# Altium footprint library Power_Lib_Altium.PcbLib: 383 footprints (part 4 of 24)
Each footprint in its own frame and in the unit in brackets; x right, y up, seen from the top. Pads: shape width x height; smd on the part's side, far side on the other; paste and mask are expansions set on the pad; w line width, h text height; cw(c..) or ccw(c..) is an arc to the next point about the centre after c.
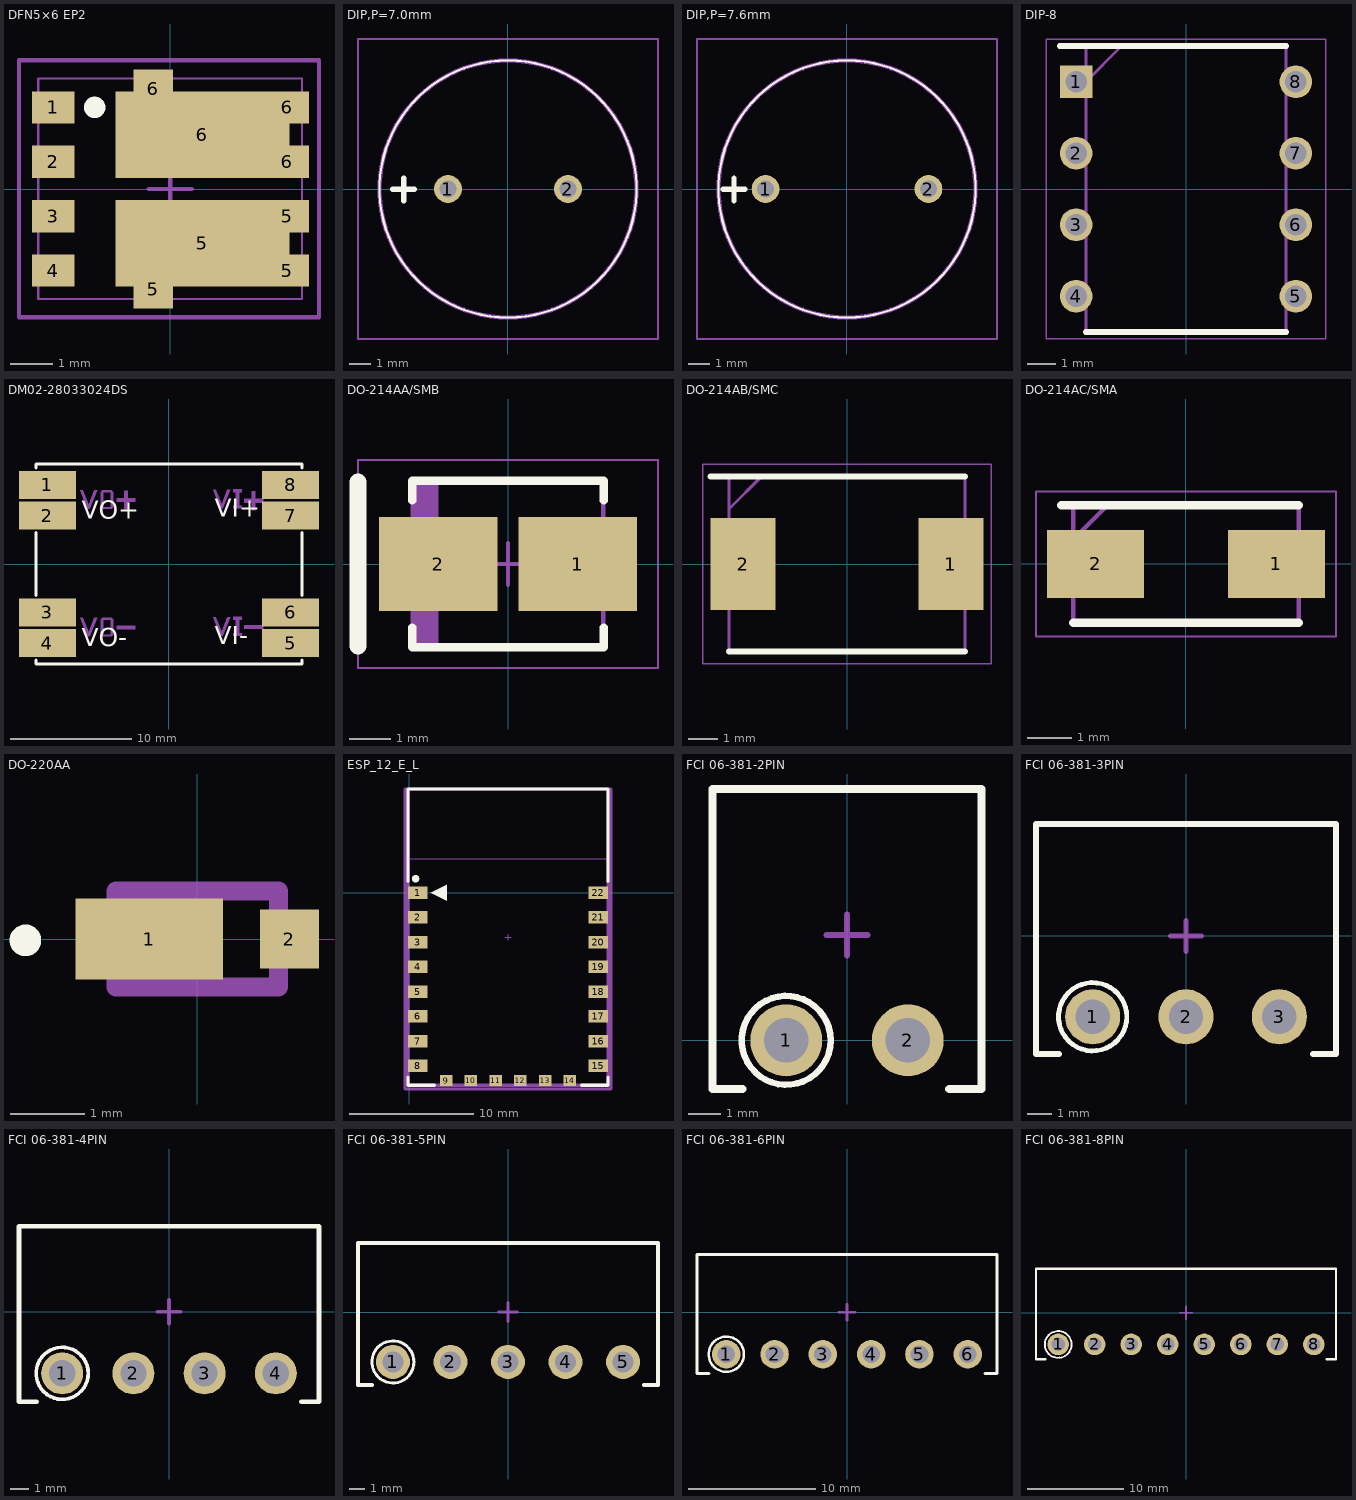
[diagram p3: the footprints below, top view; thin cyan lines are the x and y axes]

## DFN5×6 EP2 [mm]
pads (12):
  rect 1x0.75 smd: 1(-2.73,1.905) 2(-2.73,0.635) 3(-2.73,-0.635) 4(-2.73,-1.905) 5(2.73,-1.905) 5(2.73,-0.635) 6(2.73,0.635) 6(2.73,1.905)
  rect 0.92x0.905 smd: 5(-0.394,-2.337) 6(-0.394,2.337)
  rect 4.055x2.02 smd: 5(0.749,-1.27) 6(0.749,1.27)
Top Overlay:
  circle w0.25: c-1.765,1.905 r0.125
Mechanical 13:
  lines w0.051: -0.254,0 0.254,0 ; 0,-0.254 0,0.254 ; -3.08,-2.57 -3.08,2.58 3.07,2.58 3.07,-2.57 -3.08,-2.57
Mechanical 14:
  lines w0.1: -3.531,-2.995 3.47,-2.995 3.47,3.005 -3.531,3.005 -3.531,-2.995
Mechanical 15:
  lines w0.1: -0.5,0 0.5,0 ; 0,-0.5 0,0.5
3D body "DFN5x6_SO8FL.STEP": height 1.12, standoff -0.01, extent -3.08,-2.57 3.07,2.58

## DIP,P=7.0mm [mm]
pads (2):
  round 1.3 hole 0.8: 1(-2.8,0) 2(2.8,0)
Top Overlay:
  lines w0.1: 0,-6 ccw(c0,0) 0,6 ccw(c0,0) 0,-6
  lines w0.254: -5.382,-0.016 -4.874,-0.016 ; -4.874,0.508 -4.874,-0.54 -4.874,-0.016 ; -4.874,-0.016 -4.366,-0.016 -4.874,-0.016
Mechanical 13:
  lines w0.2: 0,-6 ccw(c0,0) 0,6 ccw(c0,0) 0,-6
Mechanical 15:
  lines w0.1: -7,-7 -7,7 7,7 7,-7 -7,-7
3D body "TMB12A12.stp": height 9.9, standoff -5, extent -6,-6 6,6

## DIP,P=7.6mm [mm]
pads (2):
  round 1.3 hole 0.8: 1(-3.8,0) 2(3.8,0)
Top Overlay:
  lines w0.1: 0,-6 cw(c0,0) 0,6 cw(c0,0) 0,-6
  lines w0.254: -5.782,-0.016 -5.274,-0.016 -4.766,-0.016 ; -5.274,-0.54 -5.274,0.508
Mechanical 13:
  lines w0.2: 0,-6 cw(c0,0) 0,6 cw(c0,0) 0,-6
Mechanical 15:
  lines w0.1: -7,-7 7,-7 7,7 -7,7 -7,-7
3D body "TMB12A12.stp": height 9.9, standoff -5, extent -6,-6 6,6

## DIP-8 [mm]
pads (8):
  rect 1.159x1.159 hole 0.759: 1(-3.905,3.81)
  round 1.159 hole 0.759: 2(-3.905,1.27) 3(-3.905,-1.27) 4(-3.905,-3.81) 5(3.905,-3.81) 6(3.905,-1.27) 7(3.905,1.27) 8(3.905,3.81)
Top Overlay:
  lines w0.2: -4.485,5.08 3.556,5.08 ; -3.556,-5.08 3.556,-5.08
Mechanical 13:
  lines w0.1: -3.556,3.81 -2.286,5.08 ; -3.556,-5.08 3.556,-5.08 3.556,5.08 -3.556,5.08 -3.556,-5.08
Mechanical 15:
  lines w0.05: -4.957,-5.33 4.957,-5.33 4.957,5.33 -4.957,5.33 -4.957,-5.33
3D body "ATTINY85-20PU.stp": height 5.33, standoff -3.5, extent -4.045,-4.75 4.045,4.75

## DM02-28033024DS [mm]
pads (8):
  rect 4.7x2.3 smd: 1(-10.05,6.54) 2(-10.05,4) 3(-10.05,-4) 4(-10.05,-6.54) 5(10.05,-6.54) 6(10.05,-4) 7(10.05,4) 8(10.05,6.54)
Top Overlay:
  lines w0.254: -11,-7.921 -11,-8.25 11,-8.25 11,-7.921 ; -11,-2.619 -11,2.619 ; -11,7.921 -11,8.25 11,8.25 11,7.95 ; 11,-2.619 11,2.619
  text "VI+" at 3.8,3.89 h1.5
  text "VI-" at 3.8,-6.65 h1.5
  text "VO-" at -7.2,-6.79 h1.5
  text "VO+" at -7.2,3.75 h1.5
Mechanical 15:
  circle w0.8: c-11,6.6 r0.4
  region: 6.85,4.45 6.85,5.05 6.85,6 7.15,6 7.15,4.45
  region: 4.801,6.15 4.351,4.95 3.851,6.15 3.651,6.15 4.251,4.6 4.451,4.6 5.051,6.15
  region: 5.3,6.165 6,6.165 6,5.915 5.8,5.915 5.8,4.815 6,4.815 6,4.615 5.3,4.615 5.3,4.815 5.5,4.815 5.5,5.915 5.3,5.915
  region: 6.225,5.375 6.825,5.375 7.775,5.375 7.775,5.075 6.225,5.075
  region: 5.3,-4.375 6,-4.375 6,-4.625 5.8,-4.625 5.8,-5.725 6,-5.725 6,-5.925 5.3,-5.925 5.3,-5.725 5.5,-5.725 5.5,-4.625 5.3,-4.625
  region: 4.8,-4.39 4.35,-5.59 3.85,-4.39 3.65,-4.39 4.25,-5.94 4.45,-5.94 5.05,-4.39
  region: 6.225,-5.05 6.825,-5.05 7.775,-5.05 7.775,-5.35 6.225,-5.35
  region: -6.2,-4.44 -6.65,-5.64 -7.15,-4.44 -7.35,-4.44 -6.75,-5.99 -6.55,-5.99 -5.95,-4.44
  region: -4.6,-5.84 -4.75,-5.99 -5.5,-5.99 -5.65,-5.79 -5.65,-4.59 -5.5,-4.44 -5.45,-4.44 -5.45,-4.59 -5.45,-5.84 -4.8,-5.84 -4.8,-4.59 -5.4,-4.59 -5.4,-4.44 -4.75,-4.44 -4.6,-4.59
  region: -4.325,-5.09 -3.725,-5.09 -2.775,-5.09 -2.775,-5.39 -4.325,-5.39
  region: -3.7,4.525 -3.7,5.125 -3.7,6.075 -3.4,6.075 -3.4,4.525
  region: -4.325,5.45 -3.725,5.45 -2.775,5.45 -2.775,5.15 -4.325,5.15
  region: -4.6,4.7 -4.75,4.55 -5.5,4.55 -5.65,4.75 -5.65,5.95 -5.5,6.1 -5.45,6.1 -5.45,5.95 -5.45,4.7 -4.8,4.7 -4.8,5.95 -5.4,5.95 -5.4,6.1 -4.75,6.1 -4.6,5.95
  region: -6.2,6.1 -6.65,4.9 -7.15,6.1 -7.35,6.1 -6.75,4.55 -6.55,4.55 -5.95,6.1
3D body: height 4.5, standoff 0, extent -10.989,-8.255 10.973,8.248

## DO-214AA/SMB [mm]
pads (2):
  rect 2.85x2.25 smd: 1(1.675,0) 2(-1.675,0)
Top Overlay:
  lines w0.2: -2.3,-1.525 -2.3,-2 2.3,-2 2.3,-1.525 ; -2.3,1.525 -2.3,2 2.3,2 2.3,1.525
  lines w0.4: -3.6,-1.97 -3.6,1.97
Mechanical 13:
  region: -1.67,1.97 -2.285,1.97 -2.285,-1.97 -1.67,-1.97
  lines w0.1: -2.285,-1.97 2.285,-1.97 2.285,1.97 -2.285,1.97 -2.285,-1.97
Mechanical 15:
  lines w0.05: -3.6,-2.5 3.6,-2.5 3.6,2.5 -3.6,2.5 -3.6,-2.5
  lines w0.1: -0.5,0 0.5,0 ; 0,-0.5 0,0.5
3D body "DIOM4336X24M.step": height 2.44, standoff 0, extent -2.505,-1.97 2.505,1.97

## DO-214AB/SMC [mm]
pads (2):
  rect 2.2x3.1 smd: 1(3.5,0) 2(-3.5,0)
Top Overlay:
  lines w0.2: -4.6,2.952 3.97,2.952 ; -3.97,-2.952 3.97,-2.952
Mechanical 13:
  lines w0.1: -3.97,1.852 -2.87,2.952 ; -3.97,-2.952 3.97,-2.952 3.97,2.952 -3.97,2.952 -3.97,-2.952
Mechanical 15:
  lines w0.05: -4.85,-3.36 4.85,-3.36 4.85,3.36 -4.85,3.36 -4.85,-3.36
3D body "B540C-13-F.stp": height 2.5, standoff 0, extent -3.97,-2.953 3.97,2.953

## DO-214AC/SMA [mm]
pads (2):
  rect 2.2x1.55 smd: 1(2.05,0) 2(-2.05,0)
Top Overlay:
  lines w0.2: -2.825,1.332 2.552,1.332 ; -2.552,-1.332 2.552,-1.332
Mechanical 13:
  lines w0.1: -2.552,0.558 -1.778,1.332 ; -2.552,-1.332 2.552,-1.332 2.552,1.332 -2.552,1.332 -2.552,-1.332
Mechanical 15:
  lines w0.05: -3.4,-1.645 3.4,-1.645 3.4,1.645 -3.4,1.645 -3.4,-1.645
3D body "SS14-E3_61T.stp": height 2.29, standoff 0, extent -2.552,-1.332 2.552,1.332

## DO-220AA [mm]
pads (2):
  rect 2x1.1 smd: 1(-0.65,0)
  rect 0.8x0.8 smd: 2(1.25,0)
Top Overlay:
  circle w0.254: c-2.326,-0.019 r0.087
Mechanical 13:
  lines w0.254: -1.1,-0.65 -1.1,0.65 1.1,0.65 1.1,-0.65 -1.1,-0.65

## ESP_12_E_L [mm] "ESP-12 Wi-Fi Module by AI-Thinker"
height 3.2
pads (22):
  rect 1.6x1 smd: 1(0.7,0) 2(0.7,-2) 3(0.7,-4) 4(0.7,-6) 5(0.7,-8) 6(0.7,-10) 7(0.7,-12) 8(0.7,-14) 15(15.3,-14) 16(15.3,-12) 17(15.3,-10) 18(15.3,-8) 19(15.3,-6) 20(15.3,-4) 21(15.3,-2) 22(15.3,0)
  rect 1x0.9 smd: 9(3,-15.2) 10(5,-15.2) 11(7,-15.2) 12(9,-15.2) 13(11,-15.2) 14(13,-15.2)
Top Overlay:
  circle w0.3: c0.525,1.125 r0.15
  region: 1.77,0 3.04,-0.635 3.04,0.635
  lines w0.254: -0.084,-14.916 -0.084,-15.568 2.068,-15.568 ; -0.084,0.916 -0.084,8.371 16.084,8.371 16.084,0.916 ; 13.932,-15.568 16.084,-15.568 16.084,-14.916
Mechanical 13:
  lines w0.051: -0.127,2.727 -0.127,8.382 16.129,8.382 16.129,2.727 -0.127,2.727
  lines w0.254: -0.084,-15.568 16.084,-15.568 16.084,8.371 -0.084,8.371 -0.084,-15.568
  text "CUTOUT POLYGON" at 1.499,7.315 h0.25
  text "ANTENNA AREA" at 1.499,7.823 h0.25
Mechanical 15:
  lines w0.1: 7.746,-3.598 8.254,-3.598 ; 8,-3.852 8,-3.344
  lines w0.254: -0.325,-15.875 -0.325,8.371 16.325,8.371 16.325,-15.875 -0.325,-15.875
3D body "ESP_12_E.STEP": height 2.75, standoff 0.04, extent 0.001,-15.491 16.001,8.509

## FCI 06-381-2PIN [mm] "FCI Pluggable Terminal Block"
height 7
pads (2):
  round 2.25 hole 1.4: 1(-1.905,0) 2(1.905,0)
Top Overlay:
  circle w0.2: c-1.905,0 r1.393
  lines w0.254: -3.275,-1.524 -4.218,-1.524 -4.218,7.874 4.218,7.874 4.218,-1.524 3.202,-1.524
Mechanical 15:
  lines w0.2: -0.635,3.302 0.635,3.302 ; 0,2.667 0,3.937
3D body "FCI 06-381 2Pos.STEP": height 7.6, standoff -3.52, extent -4.405,-1.397 4.405,7.803

## FCI 06-381-3PIN [mm] "FCI Pluggable Terminal Block"
height 7
pads (3):
  round 2.25 hole 1.4: 1(-3.81,-3.302) 2(0,-3.302) 3(3.81,-3.302)
Top Overlay:
  circle w0.2: c-3.81,-3.302 r1.393
  lines w0.254: -5.18,-4.826 -6.123,-4.826 -6.123,4.572 6.123,4.572 6.123,-4.826 5.18,-4.826
Mechanical 15:
  lines w0.2: -0.635,0 0.635,0 ; 0,-0.635 0,0.635
3D body "FCI 06-381 3Pos.STEP": height 7.6, standoff -3.52, extent -6.31,-4.699 6.31,4.501

## FCI 06-381-4PIN [mm] "FCI Pluggable Terminal Block"
height 7
pads (4):
  round 2.25 hole 1.4: 1(-5.715,-3.302) 2(-1.905,-3.302) 3(1.905,-3.302) 4(5.715,-3.302)
Top Overlay:
  circle w0.2: c-5.715,-3.302 r1.393
  lines w0.254: -7.085,-4.826 -8.028,-4.826 -8.028,4.572 8.028,4.572 8.028,-4.826 7.085,-4.826
Mechanical 15:
  lines w0.2: -0.635,0 0.635,0 ; 0,-0.635 0,0.635
3D body "FCI 06-381 4Pos.STEP": height 7.6, standoff -3.52, extent -8.215,-4.699 8.215,4.501

## FCI 06-381-5PIN [mm] "FCI Pluggable Terminal Block"
height 7
pads (5):
  round 2.25 hole 1.4: 1(-7.62,-3.302) 2(-3.81,-3.302) 3(0,-3.302) 4(3.81,-3.302) 5(7.62,-3.302)
Top Overlay:
  circle w0.2: c-7.62,-3.302 r1.393
  lines w0.254: -8.99,-4.826 -9.933,-4.826 -9.933,4.572 9.933,4.572 9.933,-4.826 8.99,-4.826
Mechanical 15:
  lines w0.2: -0.635,0 0.635,0 ; 0,-0.635 0,0.635
3D body "FCI 06-381 5Pos.STEP": height 7.6, standoff -3.52, extent -10.12,-4.699 10.12,4.501

## FCI 06-381-6PIN [mm] "FCI Pluggable Terminal Block"
height 7
pads (6):
  round 2.25 hole 1.4: 1(-9.525,-3.302) 2(-5.715,-3.302) 3(-1.905,-3.302) 4(1.905,-3.302) 5(5.715,-3.302) 6(9.525,-3.302)
Top Overlay:
  circle w0.2: c-9.525,-3.302 r1.393
  lines w0.254: -10.895,-4.826 -11.838,-4.826 -11.838,4.572 11.838,4.572 11.838,-4.826 10.895,-4.826
Mechanical 15:
  lines w0.2: -0.635,0 0.635,0 ; 0,-0.635 0,0.635
3D body "FCI 06-381 6Pos.STEP": height 7.6, standoff -3.52, extent -12.025,-4.699 12.025,4.501

## FCI 06-381-8PIN [mm] "FCI Pluggable Terminal Block"
height 7
pads (8):
  round 2.25 hole 1.4: 1(-13.335,-3.302) 2(-9.525,-3.302) 3(-5.715,-3.302) 4(-1.905,-3.302) 5(1.905,-3.302) 6(5.715,-3.302) 7(9.525,-3.302) 8(13.335,-3.302)
Top Overlay:
  circle w0.2: c-13.335,-3.302 r1.393
  lines w0.254: -14.705,-4.826 -15.648,-4.826 -15.648,4.572 15.648,4.572 15.648,-4.826 14.705,-4.826
Mechanical 15:
  lines w0.2: -0.635,0 0.635,0 ; 0,-0.635 0,0.635
3D body "FCI 06-381 8Pos.STEP": height 7.6, standoff -3.52, extent -15.835,-4.699 15.835,4.501